# Altium footprint library rescap.PcbLib: 77 footprints (part 3 of 5)
Each footprint in its own frame and in the unit in brackets; x right, y up, seen from the top. Pads: shape width x height; smd on the part's side, far side on the other; paste and mask are expansions set on the pad; w line width, h text height; cw(c..) or ccw(c..) is an arc to the next point about the centre after c.
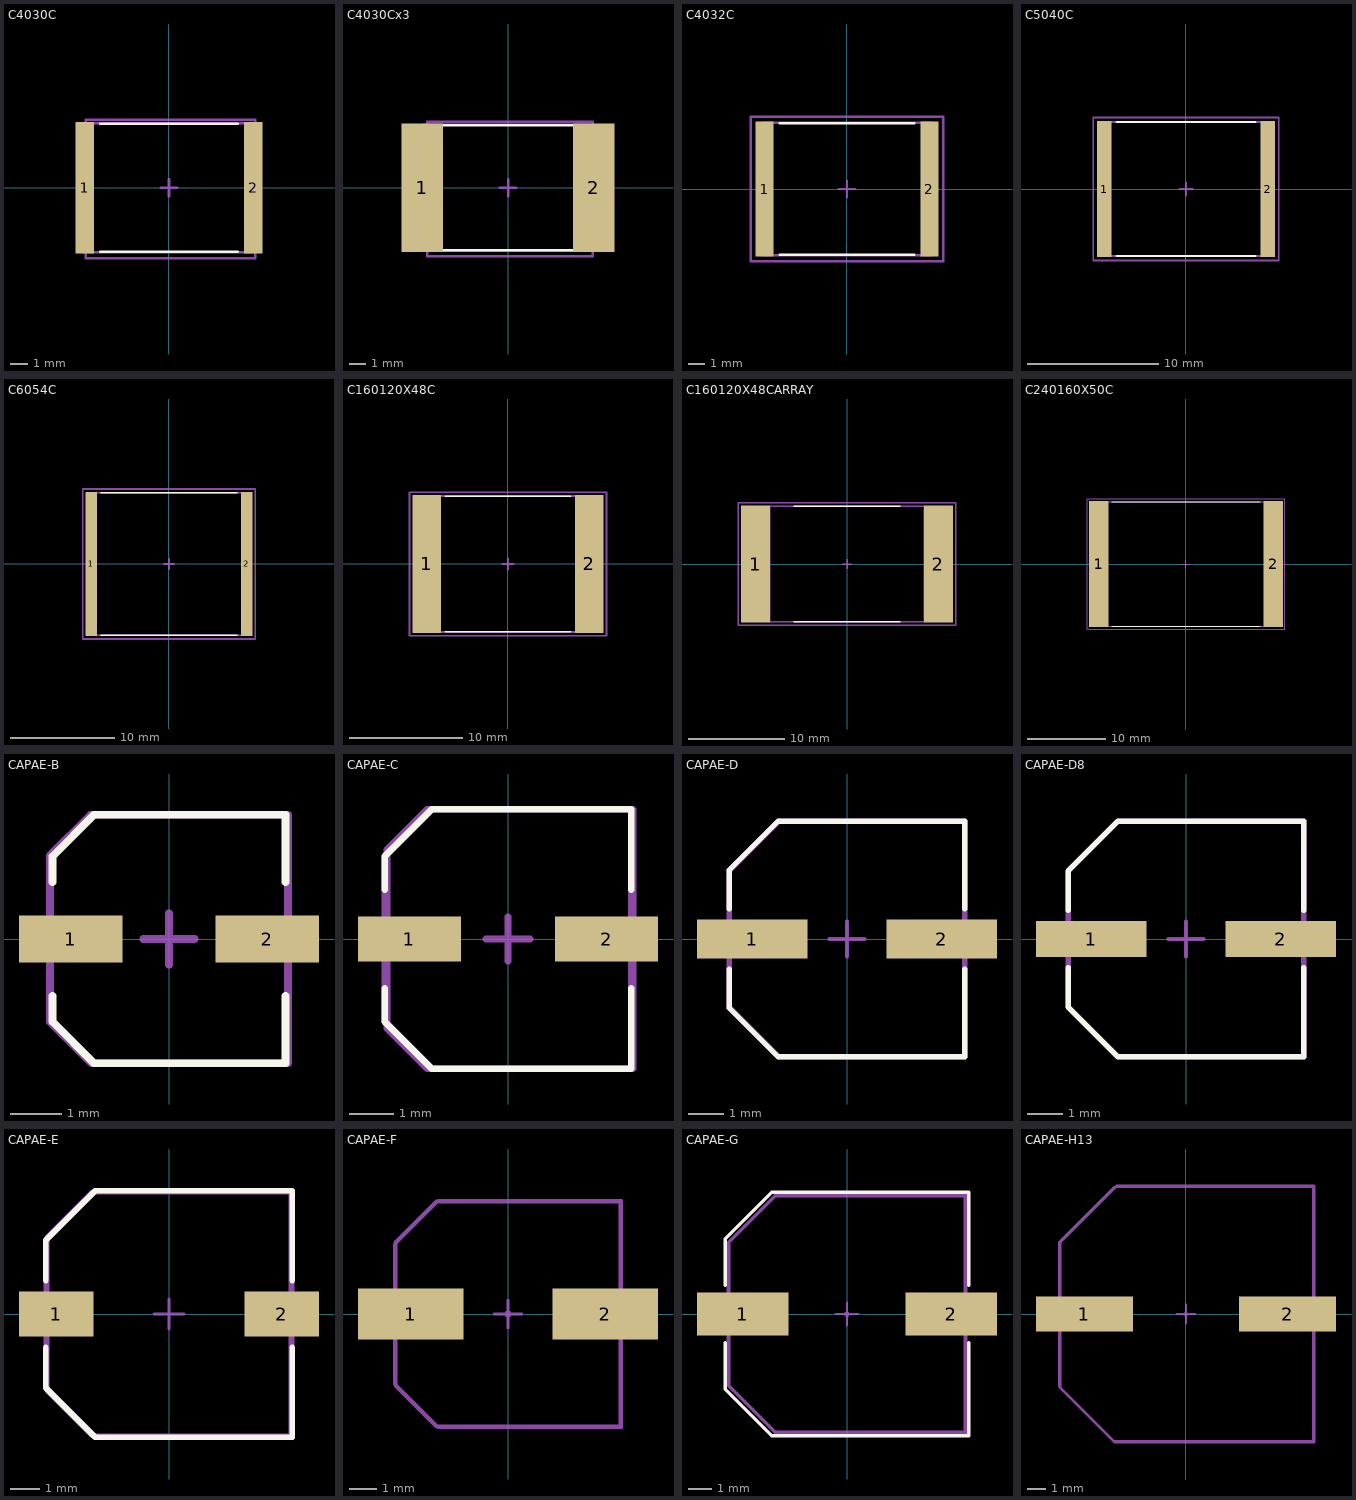
[diagram p2: the footprints below, top view; thin cyan lines are the x and y axes]

## C4030C [mm] "Chip Capacitor, 2-Leads, Body 10,20x7,60mm, IPC Medium Density"
height 3.9
pads (2):
  rect 1.1x7.75 smd: 1(-4.975,0) 2(4.975,0)
Top Overlay:
  lines w0.15: -4.05,-3.775 4.05,-3.775 ; -4.05,3.775 4.05,3.775
Top Courtyard:
  lines w0.15: -0.5,0 0.5,0 ; 0,-0.5 0,0.5 ; -4.9,-4.15 5.1,-4.15 5.1,4 -4.9,4 -4.9,-4.15
Mechanical 29:
  lines w0.15: -5.1,-3.8 5.1,-3.8 5.1,3.8 -5.1,3.8 -5.1,-3.8
  text ".Designator" at -3.4,-0.2 h1
3D body "SMD4030.STEP": height 3, standoff 0, extent -4.9,-4.2 5.1,4

## C4030Cx3 [mm] "Chip Capacitor, 2-Leads, Body 10,20x7,60mm, IPC Medium Density"
height 3.9
pads (2):
  rect 2.5x7.75 smd: 1(-5.2,0) 2(5.175,0)
Top Overlay:
  lines w0.15: -4.05,-3.775 4.05,-3.775 ; -4.05,3.775 4.05,3.775
Top Courtyard:
  lines w0.15: -0.5,0 0.5,0 ; 0,-0.5 0,0.5 ; -4.9,-4.15 -4.9,4 5.1,4 5.1,-4.15 -4.9,-4.15
Mechanical 29:
  lines w0.15: -5.1,-3.8 -5.1,3.8 5.1,3.8 5.1,-3.8 -5.1,-3.8
  text ".Designator" at -3.5,-0.3 h1
3D body "SMD4030.STEP": height 8.5, standoff 5.5, extent -4.9,-4.2 5.1,4
3D body "SMD4030.STEP": height 5.7, standoff 2.7, extent -4.9,-4.2 5.1,4
3D body "SMD4030.STEP": height 3, standoff 0, extent -4.9,-4.2 5.1,4
3D body: height 8, standoff 0, extent -0.501,-0.501 0.501,0.501

## C4032C [mm] "Chip Capacitor, 2-Leads, Body 10,20x8,00mm, IPC Medium Density"
height 3.2
pads (2):
  rect 1.1x8.15 smd: 1(-4.975,0) 2(4.975,0)
Top Overlay:
  lines w0.15: -4.05,-3.975 4.05,-3.975 ; -4.05,3.975 4.05,3.975
Top Courtyard:
  lines w0.15: -0.5,0 0.5,0 ; 0,-0.5 0,0.5 ; -5.8,-4.35 -5.8,4.35 5.8,4.35 5.8,-4.35 -5.8,-4.35
Mechanical 29:
  lines w0.15: -5.1,-4 -5.1,4 5.1,4 5.1,-4 -5.1,-4
  text ".Designator" at -3.8,-0.3 h1
3D body "C4032C.step": height 3.2, standoff 0, extent -5.1,-4 5.1,4

## C5040C [mm] "Chip Capacitor, 2-Leads, Body 12,70x10,20mm, IPC Medium Density"
height 4
pads (2):
  rect 1.1x10.35 smd: 1(-6.225,0) 2(6.225,0)
Top Overlay:
  lines w0.15: -5.3,-5.075 5.3,-5.075 ; -5.3,5.075 5.3,5.075
Top Courtyard:
  lines w0.15: -0.5,0 0.5,0 ; 0,-0.5 0,0.5 ; -7.05,-5.45 7.05,-5.45 7.05,5.45 -7.05,5.45 -7.05,-5.45
Mechanical 29:
  lines w0.15: -6.35,-5.1 6.35,-5.1 6.35,5.1 -6.35,5.1 -6.35,-5.1
  text ".Designator" at -3.8,-0.2 h1
3D body "C5040C.step": height 4, standoff 0, extent -6.35,-5.1 6.35,5.1

## C6054C [mm] "Chip Capacitor, 2-Leads, Body 15,20x13,70mm, IPC Medium Density"
height 4.8
pads (2):
  rect 1.1x13.85 smd: 1(-7.475,0) 2(7.475,0)
Top Overlay:
  lines w0.15: -6.55,-6.825 6.55,-6.825 ; -6.55,6.825 6.55,6.825
Top Courtyard:
  lines w0.15: -0.5,0 0.5,0 ; 0,-0.5 0,0.5 ; -8.3,-7.2 -8.3,7.2 8.3,7.2 8.3,-7.2 -8.3,-7.2
Mechanical 29:
  lines w0.15: -7.6,-6.85 -7.6,6.85 7.6,6.85 7.6,-6.85 -7.6,-6.85
  text ".Designator" at -3.7,-0.3 h1
3D body: height 4.8, standoff 0, extent -7,-6.85 7,6.85
3D body: height 4.8, standoff 0, extent -7.6,-6.85 -7,6.85
3D body: height 4.8, standoff 0, extent 7,-6.85 7.6,6.85

## C160120X48С [mm] "Chip Capacitor, 2-Leads, Body 16,00x12,00mm, IPC Medium Density"
height 4.8
pads (2):
  rect 2.5x12.15 smd: 1(-7.175,0) 2(7.175,0)
Top Overlay:
  lines w0.15: -5.55,-5.975 5.55,-5.975 ; -5.55,5.975 5.55,5.975
Top Courtyard:
  lines w0.15: -0.5,0 0.5,0 ; 0,-0.5 0,0.5 ; -8.7,-6.35 8.7,-6.35 8.7,6.35 -8.7,6.35 -8.7,-6.35
Mechanical 29:
  lines w0.15: -8,-6 8,-6 8,6 -8,6 -8,-6
  text ".Designator" at -3.2,-0.3 h1
3D body: height 4.8, standoff 0, extent 6,-6 8,6
3D body: height 4.8, standoff 0, extent -8,-6 -6,6
3D body: height 4.8, standoff 0, extent -6,-6 6,6

## C160120X48СARRAY [mm] "3x Chip Capacitor, 2-Leads, Body 16,00x12,00mm, IPC Medium Density"
height 16
pads (2):
  rect 3x12.15 smd: 1(-9.5,0) 2(9.5,0)
Top Overlay:
  lines w0.15: -5.55,-5.975 5.55,-5.975 ; -5.55,5.975 5.55,5.975
Top Courtyard:
  lines w0.15: -0.5,0 0.5,0 ; 0,-0.5 0,0.5 ; -11.3,-6.35 11.3,-6.35 11.3,6.35 -11.3,6.35 -11.3,-6.35
Mechanical 29:
  lines w0.15: -8,-6 8,-6 8,6 -8,6 -8,-6
  text ".Designator" at -3.7,-0.3 h1
3D body: height 19.8, standoff 15, extent 6,-6 8,6
3D body: height 19.8, standoff 15, extent -8,-6 -6,6
3D body: height 19.8, standoff 15, extent -6,-6 6,6
3D body: height 14.8, standoff 10, extent -6,-6 6,6
3D body: height 14.8, standoff 10, extent -8,-6 -6,6
3D body: height 14.8, standoff 10, extent 6,-6 8,6
3D body: height 9.8, standoff 5, extent -6,-6 6,6
3D body: height 9.8, standoff 5, extent -8,-6 -6,6
3D body: height 9.8, standoff 5, extent 6,-6 8,6
3D body: height 4.8, standoff 0, extent 6,-6 8,6
3D body: height 4.8, standoff 0, extent -8,-6 -6,6
3D body: height 4.8, standoff 0, extent -6,-6 6,6

## C240160X50C [mm] "Chip Capacitor, 2-Leads, Body 24,00x16,00mm, IPC Medium Density"
height 5
pads (2):
  rect 2.5x16.15 smd: 1(-11.175,0) 2(11.175,0)
Top Overlay:
  lines w0.15: -9.55,-7.975 9.55,-7.975 ; -9.55,7.975 9.55,7.975
Top Courtyard:
  lines w0.15: -0.5,0 0.5,0 ; 0,-0.5 0,0.5 ; -12.7,-8.35 12.7,-8.35 12.7,8.35 -12.7,8.35 -12.7,-8.35
Mechanical 29:
  lines w0.15: -12,-8 12,-8 12,8 -12,8 -12,-8
  text ".Designator" at -3.3,-0.3 h1
3D body: height 5, standoff 0, extent 10,-8 12,8
3D body: height 5, standoff 0, extent -12,-8 -10,8
3D body: height 5, standoff 0, extent -10,-8 10,8

## CAPAE-B [mm] "Aluminum Electrolytic Capacitor, Body 4,40x4,80x5,70mm, IPC Medium Density"
height 5.7
pads (2):
  rect 2x0.9 smd: 1(-1.9,0) 2(1.9,0)
Top Overlay:
  lines w0.15: -2.25,-1.1 -2.25,-1.6 -1.45,-2.4 2.25,-2.4 2.25,-1.1 ; -2.25,1.1 -2.25,1.6 -1.45,2.4 2.25,2.4 2.25,1.1
Top Courtyard:
  lines w0.15: -0.5,0 0.5,0 ; 0,-0.5 0,0.5 ; -2.3,-1.6 -2.3,-0.6 -2.3,0.6 -2.3,1.615 -1.515,2.4 2.3,2.4 2.3,0.6 2.3,-0.6 2.3,-2.4 -1.5,-2.4 -2.3,-1.6
3D body "CAPAE5548X57N.step": height 5.7, standoff 0, extent -2.75,-2.4 2.75,2.4

## CAPAE-C [mm] "Aluminum Electrolytic Capacitor, Body 5,40x5,80x5,70mm, IPC Medium Density"
height 5.7
pads (2):
  rect 2.3x1 smd: 1(-2.2,0) 2(2.2,0)
Top Overlay:
  lines w0.15: -2.75,-1.1 -2.75,-1.85 -1.7,-2.9 2.75,-2.9 2.75,-1.1 ; -2.75,1.1 -2.75,1.85 -1.7,2.9 2.75,2.9 2.75,1.1
Top Courtyard:
  lines w0.15: -0.5,0 0.5,0 ; 0,-0.5 0,0.5 ; -2.7,-2 -2.7,-0.6 -2.7,0.6 -2.7,2 -1.8,2.9 2.8,2.9 2.8,0.6 2.8,-0.6 2.8,-2.9 -1.8,-2.9 -2.7,-2
Mechanical 29:
  lines w0.15: -2.75,-1.85 -2.75,1.85 -1.7,2.9 2.75,2.9 2.75,-2.9 -1.7,-2.9 -2.75,-1.85
  text ".Designator" at -2.6,-0.3 h1
3D body "CAPAE6558X57N.step": height 5.7, standoff 0, extent -3.25,-2.9 3.25,2.9

## CAPAE-D [mm] "Aluminum Electrolytic Capacitor, Body 6,60x6,60x5,80mm, IPC High Density"
height 5.8
pads (2):
  rect 3.1x1.1 smd: 1(-2.65,0) 2(2.65,0)
Top Overlay:
  lines w0.15: -3.3,-0.85 -3.3,-1.925 -1.925,-3.3 3.3,-3.3 3.3,-0.85 ; -3.3,0.85 -3.3,1.925 -1.925,3.3 3.3,3.3 3.3,0.85
Top Courtyard:
  lines w0.1: -0.5,0 0.5,0 ; 0,-0.5 0,0.5
  lines w0.15: -3.3,-1.9 -3.3,-0.5 -3.3,0.5 -3.3,1.9 -1.9,3.3 3.3,3.3 3.3,0.5 3.3,-0.5 3.3,-3.3 -1.9,-3.3 -3.3,-1.9
Mechanical 13:
  lines w0.15: -3.3,-1.925 -3.3,1.925 -1.925,3.3 3.3,3.3 3.3,-3.3 -1.925,-3.3 -3.3,-1.925
3D body "CAPAE-D.step": height 5.8, standoff -0.5, extent -3.9,-3.3 3.9,3.3

## CAPAE-D8 [mm] "Aluminum Electrolytic Capacitor, Body 6,60x6,60x7,70mm, IPC High Density"
height 7.7
pads (2):
  rect 3.1x1 smd: 1(-2.65,0) 2(2.65,0)
Top Overlay:
  lines w0.15: -3.3,-0.8 -3.3,-1.9 -1.9,-3.3 3.3,-3.3 3.3,-0.8 ; -3.3,0.8 -3.3,1.9 -1.9,3.3 3.3,3.3 3.3,0.8
Top Courtyard:
  lines w0.1: -0.5,0 0.5,0 ; 0,-0.5 0,0.5
  lines w0.15: -3.3,-1.9 -1.9,-3.3 3.3,-3.3 3.3,-0.5 3.3,0.5 3.3,3.3 -1.9,3.3 -3.3,1.9 -3.3,0.5 -3.3,-0.5 -3.3,-1.9
Mechanical 13:
  lines w0.15: -3.3,-1.9 -3.3,1.9 -1.9,3.3 3.3,3.3 3.3,-3.3 -1.9,-3.3 -3.3,-1.9
3D body "CAPAE-D8.step": height 7.7, standoff 0, extent -3.9,-3.3 3.9,3.3

## CAPAE-E [mm] "Aluminum Electrolytic Capacitor, Body 8,30x8,30x8,50mm, IPC High Density"
height 8.5
pads (2):
  rect 2.5x1.5 smd: 1(-3.8,0) 2(3.8,0)
Top Overlay:
  lines w0.2: -4.15,-1.125 -4.15,-2.488 -2.488,-4.15 4.15,-4.15 4.15,-1.125 ; -4.15,1.125 -4.15,2.488 -2.488,4.15 4.15,4.15 4.15,1.125
Top Courtyard:
  lines w0.1: -0.5,0 0.5,0 ; 0,-0.5 0,0.5
  lines w0.15: -4.1,-2.6 -4.1,-0.8 -4.1,0.8 -4.1,2.6 -2.6,4.1 4.1,4.1 4.1,0.8 4.1,-0.8 4.1,-4.1 -2.6,-4.1 -4.1,-2.6
Mechanical 13:
  lines w0.15: -4.15,-2.488 -2.488,-4.15 4.15,-4.15 4.15,4.15 -2.488,4.15 -4.15,2.488 -4.15,-2.488
3D body "CAPAE-E.step": height 8.5, standoff 0, extent -4.75,-4.15 4.75,4.15

## CAPAE-F [mm] "Aluminum Electrolytic Capacitor, Body 8,30x8,30x10,20mm, IPC High Density"
height 10.2
pads (2):
  rect 3.85x1.85 smd: 1(-3.55,0) 2(3.55,0)
Top Courtyard:
  lines w0.05: -0.075,-0.075 0.075,-0.075 0.075,0.075 -0.075,0.075 -0.075,-0.075
  lines w0.1: -0.5,0 0.5,0 ; 0,-0.5 0,0.5
  lines w0.15: -4.1,-2.6 -4.1,-0.9 -4.1,0.9 -4.1,2.6 -2.6,4.1 4.1,4.1 4.1,0.9 4.1,-0.9 4.1,-4.1 -2.6,-4.1 -4.1,-2.6
Mechanical 13:
  lines w0.1: -4.15,-2.538 -4.15,2.538 -2.538,4.15 4.15,4.15 4.15,-4.15 -2.538,-4.15 -4.15,-2.538
3D body "CAPAE10083X102L.step": height 10.2, standoff 0, extent -5,-4.15 5,4.15

## CAPAE-G [mm] "Aluminum Electrolytic Capacitor, Body 10,30x10,30x10,20mm, IPC High Density"
height 10.2
pads (2):
  rect 3.95x1.85 smd: 1(-4.5,0) 2(4.5,0)
Top Overlay:
  lines w0.15: -5.25,-1.25 -5.25,-3.25 -3.25,-5.25 -3,-5.25 5.25,-5.25 5.25,-1.25 ; -5.25,1.25 -5.25,3.25 -3.25,5.25 -3,5.25 5.25,5.25 5.25,1.25
Top Courtyard:
  lines w0.05: -0.075,-0.075 -0.075,0.075 0.075,0.075 0.075,-0.075 -0.075,-0.075
  lines w0.1: -0.5,0 0.5,0 ; 0,-0.5 0,0.5
  lines w0.15: -5.1,-3.1 -3.1,-5.1 5.1,-5.1 5.1,-1 5.1,1 5.1,5.1 -3.1,5.1 -5.1,3.1 -5.1,1 -5.1,-1 -5.1,-3.1
Mechanical 13:
  lines w0.1: -5.15,-3.037 -3.038,-5.15 5.15,-5.15 5.15,5.15 -3.038,5.15 -5.15,3.037 -5.15,-3.037
3D body "CAPAE120103X102L.step": height 10.2, standoff 0, extent -6,-5.15 6,5.15

## CAPAE-H13 [mm] "Aluminum Electrolytic Capacitor, Body 13,50x13,50x13,50mm, IPC High Density"
height 13.5
pads (2):
  rect 5.15x1.85 smd: 1(-5.4,0) 2(5.4,0)
Top Courtyard:
  lines w0.05: -0.075,-0.075 -0.075,0.075 0.075,0.075 0.075,-0.075 -0.075,-0.075
  lines w0.1: -0.5,0 0.5,0 ; 0,-0.5 0,0.5
  lines w0.15: -6.7,-3.9 -6.7,-1.1 -6.7,1.1 -6.7,3.8 -3.7,6.8 6.8,6.8 6.8,1.1 6.8,-1.1 6.8,-6.8 -3.8,-6.8 -6.7,-3.9
Mechanical 13:
  lines w0.1: -6.75,-3.838 -3.838,-6.75 6.75,-6.75 6.75,6.75 -3.838,6.75 -6.75,3.838 -6.75,-3.838
3D body "CAPAE150135X135L.step": height 13.5, standoff 0, extent -7.5,-6.75 7.5,6.75